# Altium footprint library Pcb-hionyPcbLib.PcbLib: 580 footprints (part 10 of 37)
Each footprint in its own frame and in the unit in brackets; x right, y up, seen from the top. Pads: shape width x height; smd on the part's side, far side on the other; paste and mask are expansions set on the pad; w line width, h text height; cw(c..) or ccw(c..) is an arc to the next point about the centre after c.
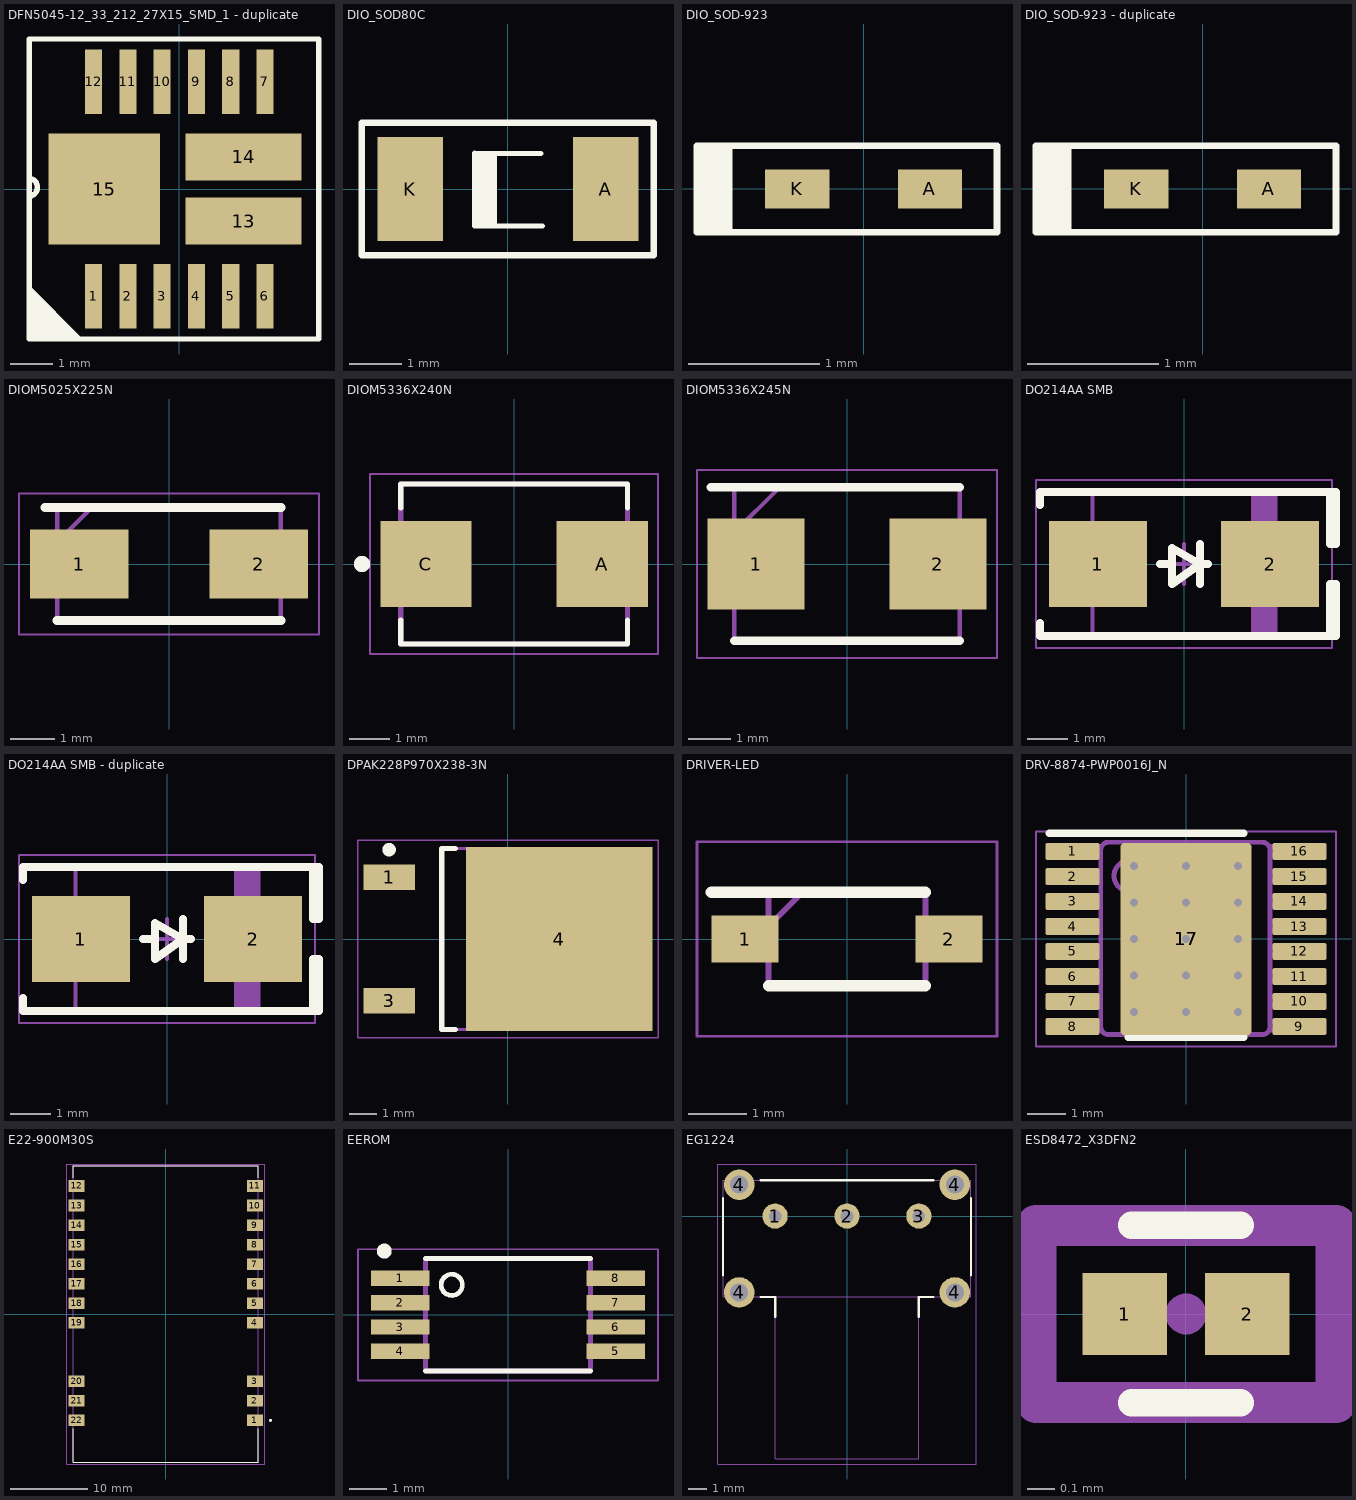
[diagram p9: the footprints below, top view; thin cyan lines are the x and y axes]

## DFN5045-12_33_212_27X15_SMD_1 - duplicate [mm]
pads (15):
  rect 0.4x1.5 smd: 1(-2,-2.5) 2(-1.2,-2.5) 3(-0.4,-2.5) 4(0.4,-2.5) 5(1.2,-2.5) 6(2,-2.5) 7(2,2.5) 8(1.2,2.5) 9(0.4,2.5) 10(-0.4,2.5) 11(-1.2,2.5) 12(-2,2.5)
  rect 2.7x1.1 smd: 13(1.5,-0.75) 14(1.5,0.75)
  rect 2.6x2.6 smd: 15(-1.75,0)
Top Overlay:
  region: -3.5,-2.25 -2.25,-3.5 -3.5,-3.5
  lines w0.127: -3.5,0.25 cw(c-3.519,0.041) -3.478,-0.164 ; -3.5,-3.5 -3.5,3.5 3.25,3.5 3.25,-3.5 -3.5,-3.5
3D body "DMHT6016LFJ-13.stp": height 0.9, standoff 0, extent -2.5,-2.36 2.5,2.36

## DIO_SOD80C [mm] "Voltage regulator diodes"
height 1.6
pads (2):
  rect 1.25x2 smd: A(1.875,0) K(-1.875,0)
Top Overlay:
  rectangle: -0.69,-0.71 -0.208,0.687
  lines w0.1: -0.639,-0.71 0.656,-0.71 ; -0.639,0.687 0.631,0.679
  lines w0.127: -2.8,-1.27 2.794,-1.27 2.794,1.27 -2.8,1.27 -2.8,-1.27
3D body "User Library-SOD80-3.STEP": height 1.5, standoff 0, extent -1.825,-0.775 1.775,0.725

## DIO_SOD-923 [mm]
pads (2):
  rect 0.49x0.3 smd: A(0.505,0) K(-0.505,0)
Top Overlay:
  rectangle: -1.27,-0.33 -1,0.33
  lines w0.05: -1.27,-0.33 1.016,-0.33 1.016,0.33 -1.27,0.33 -1.27,-0.33
3D body "DIODE_SOD-923.step": height 0.44, standoff 0.01, extent -0.525,-0.325 0.525,0.325

## DIO_SOD-923 - duplicate [mm]
pads (2):
  rect 0.49x0.3 smd: A(0.505,0) K(-0.505,0)
Top Overlay:
  rectangle: -1.27,-0.33 -1,0.33
  lines w0.05: -1.27,-0.33 -1.27,0.33 1.016,0.33 1.016,-0.33 -1.27,-0.33
3D body "DIODE_SOD-923.step": height 0.44, standoff 0.01, extent -0.525,-0.325 0.525,0.325

## DIOM5025X225N [mm]
pads (2):
  rect 2.2x1.55 smd: 1(-2,0) 2(2,0)
Top Overlay:
  lines w0.2: -2.775,1.262 2.5,1.262 ; -2.5,-1.262 2.5,-1.262
Mechanical 13:
  lines w0.1: -2.5,0.488 -1.725,1.262 ; -2.5,-1.262 -2.5,1.262 2.5,1.262 2.5,-1.262 -2.5,-1.262
Mechanical 15:
  lines w0.05: -3.35,-1.575 -3.35,1.575 3.35,1.575 3.35,-1.575 -3.35,-1.575
3D body "1SMA4742A.stp": height 2.25, standoff 0, extent -2.5,-1.262 2.5,1.262

## DIOM5336X240N [mm]
pads (2):
  rect 2.25x2.13 smd: A(2.175,0) C(-2.175,0)
Top Overlay:
  circle w0.2: c-3.75,0 r0.1
  lines w0.127: -2.795,-1.385 -2.795,-1.97 2.795,-1.97 2.795,-1.385 ; -2.795,1.385 -2.795,1.97 2.795,1.97 2.795,1.385
Mechanical 13:
  circle w0.2: c-3.75,0 r0.1
  lines w0.127: -2.795,-1.97 2.795,-1.97 2.795,1.97 -2.795,1.97 -2.795,-1.97
Mechanical 15:
  lines w0.05: -3.55,-2.22 -3.55,2.22 3.55,2.22 3.55,-2.22 -3.55,-2.22
3D body "step_temp.STEP": height 2.5, standoff 0, extent -2.648,-1.81 2.648,1.81

## DIOM5336X245N [mm]
pads (2):
  rect 2.3x2.15 smd: 1(-2.15,0) 2(2.15,0)
Top Overlay:
  lines w0.2: -3.225,1.812 2.67,1.812 ; -2.67,-1.812 2.67,-1.812
Mechanical 13:
  lines w0.1: -2.67,0.738 -1.595,1.812 ; -2.67,-1.812 2.67,-1.812 2.67,1.812 -2.67,1.812 -2.67,-1.812
Mechanical 15:
  lines w0.05: -3.55,-2.225 3.55,-2.225 3.55,2.225 -3.55,2.225 -3.55,-2.225
3D body "SMBJ20CA.stp": height 2.45, standoff 0, extent -2.67,-1.813 2.67,1.813

## DO214AA SMB [mm]
pads (2):
  rect 2.45x2.15 smd: 1(-2.15,0) 2(2.15,0)
Top Overlay:
  lines w0.2: -3.6,-1.475 -3.6,-1.8 3.8,-1.8 3.8,-0.5 3.65,-0.5 3.65,-1.8 ; -3.6,1.475 -3.6,1.8 3.8,1.8 3.8,0.5 3.65,0.5 3.65,1.8 ; -0.6,0 -0.3,0 ; 0.4,-0.5 0.4,0.5 ; 0.6,0 0.4,0 ; 0.4,0 -0.3,0.4 -0.3,-0.5 0.4,0
Mechanical 13:
  rectangle: 1.67,-1.8 2.285,1.8
  lines w0.1: -2.285,-1.8 2.285,-1.8 2.285,1.8 -2.285,1.8 -2.285,-1.8
Mechanical 15:
  lines w0.05: -3.7,-2.1 3.7,-2.1 3.7,2.1 -3.7,2.1 -3.7,-2.1
  lines w0.1: -0.5,0 0.5,0 ; 0,-0.5 0,0.5
3D body "SMB.STEP": height 2.4, standoff 0, extent -2.6,-1.799 2.6,1.8

## DO214AA SMB - duplicate [mm]
pads (2):
  rect 2.45x2.15 smd: 1(-2.15,0) 2(2.15,0)
Top Overlay:
  lines w0.2: -3.6,-1.475 -3.6,-1.8 3.8,-1.8 3.8,-0.5 3.65,-0.5 3.65,-1.8 ; -3.6,1.475 -3.6,1.8 3.8,1.8 3.8,0.5 3.65,0.5 3.65,1.8 ; -0.6,0 -0.3,0 ; 0.4,-0.5 0.4,0.5 ; 0.6,0 0.4,0 ; 0.4,0 -0.3,0.4 -0.3,-0.5 0.4,0
Mechanical 13:
  rectangle: 1.67,-1.8 2.285,1.8
  lines w0.1: -2.285,-1.8 2.285,-1.8 2.285,1.8 -2.285,1.8 -2.285,-1.8
Mechanical 15:
  lines w0.05: -3.7,-2.1 3.7,-2.1 3.7,2.1 -3.7,2.1 -3.7,-2.1
  lines w0.1: -0.5,0 0.5,0 ; 0,-0.5 0,0.5
3D body "SMB.STEP": height 2.4, standoff 0, extent -2.6,-1.799 2.6,1.8

## DPAK228P970X238-3N [mm] "D-PAK, 3-Pads, Body 6.20x6.72mm (max), IPC Medium Density"
height 2.38
pads (3):
  rect 1.9x0.95 smd: 1(-4.4,2.28) 3(-4.4,-2.28)
  rect 6.9x6.8 smd: 4(1.9,0)
Top Overlay:
  circle w0.25: c-4.4,3.305 r0.125
  lines w0.2: -1.95,-3.35 -2.45,-3.35 -2.45,3.35 -1.95,3.35
Top Courtyard:
  lines w0.05: -5.55,-3.65 5.55,-3.65 5.55,3.65 -5.55,3.65 -5.55,-3.65
  lines w0.1: -0.5,0 0.5,0 ; 0,-0.5 0,0.5
Top Assembly:
  lines w0.1: -2.45,-3.35 3.75,-3.35 3.75,3.35 -2.45,3.35 -2.45,-3.35
3D body "DPAK228P970X238-3N.step": height 2.38, standoff 0, extent -4.415,-3.35 5.285,3.35

## DRIVER-LED [mm]
pads (2):
  rect 1.15x0.8 smd: 1(-1.75,0) 2(1.75,0)
Top Overlay:
  lines w0.2: -2.325,0.8 1.345,0.8 ; -1.345,-0.8 1.345,-0.8
Mechanical 15:
  lines w0.1: -1.345,0.225 -0.77,0.8 ; -1.345,-0.8 -1.345,0.8 1.345,0.8 1.345,-0.8 -1.345,-0.8
Mechanical 20:
  lines w0.05: -2.575,-1.67 -2.575,1.67 2.575,1.67 2.575,-1.67 -2.575,-1.67
3D body "NSI50010YT1G.stp": height 1.35, standoff 0, extent -1.855,-0.8 1.855,0.8

## DRV-8874-PWP0016J_N [mm]
pads (19):
  rrect22% 1.4x0.45 smd: 1(-2.95,2.275) 2(-2.95,1.625) 3(-2.95,0.975) 4(-2.95,0.325) 5(-2.95,-0.325) 6(-2.95,-0.975) 7(-2.95,-1.625) 8(-2.95,-2.275) 9(2.95,-2.275) 10(2.95,-1.625) 11(2.95,-0.975) 12(2.95,-0.325) 13(2.95,0.325) 14(2.95,0.975) 15(2.95,1.625) 16(2.95,2.275)
  rrect6% 3.4x5 smd paste-1.7 mask-1.7: 17(0,0)
  rrect50% 2.46x3.55 on Top Paste: 17(0,0)
  rrect50% 2.46x3.55 on Top Solder: 17(0,0)
via -1.35,0.95 diameter 0.5 hole 0.2
via -1.35,0 diameter 0.5 hole 0.2
via -1.35,-1.9 diameter 0.5 hole 0.2
via -1.35,1.9 diameter 0.5 hole 0.2
via -1.35,-0.95 diameter 0.5 hole 0.2
via 1.35,0 diameter 0.5 hole 0.2
via 1.35,-0.95 diameter 0.5 hole 0.2
via 1.35,0.95 diameter 0.5 hole 0.2
via 1.35,1.9 diameter 0.5 hole 0.2
via 1.35,-1.9 diameter 0.5 hole 0.2
via 0,-1.9 diameter 0.5 hole 0.2
via 0,1.9 diameter 0.5 hole 0.2
via 0,0.95 diameter 0.5 hole 0.2
via 0,-0.95 diameter 0.5 hole 0.2
via 0,0 diameter 0.5 hole 0.2
Top Overlay:
  lines w0.2: -3.55,2.75 1.5,2.75 ; -1.5,-2.55 1.5,-2.55
Top 3D Body:
  drawing of 202 lines, arcs and shapes, not listed
  text ".Designator" at -0.5,1.85 h1.02
Mechanical 15:
  lines w0.05: -3.9,-2.8 -3.9,2.8 3.9,2.8 3.9,-2.8 -3.9,-2.8
  lines w0.1: -0.5,0 0.5,0 ; 0,-0.5 0,0.5
3D body "PWP0016J.stp": height 1.13, standoff 0, extent -3.2,-2.5 3.2,2.5

## E22-900M30S [mm]
height 3.97
pads (22):
  rect 2.08x1.51 smd: 1(11.575,-13.82) 2(11.575,-11.28) 3(11.575,-8.74) 4(11.575,-1.14) 5(11.575,1.4) 6(11.575,3.94) 7(11.575,6.48) 8(11.575,9.02) 9(11.575,11.56) 10(11.575,14.1) 11(11.575,16.64) 12(-11.575,16.64) 13(-11.575,14.1) 14(-11.575,11.56) 15(-11.575,9.02) 16(-11.575,6.48) 17(-11.575,3.94) 18(-11.575,1.4) 19(-11.575,-1.14) 20(-11.575,-8.74) 21(-11.575,-11.28) 22(-11.575,-13.82)
Top Overlay:
  circle w0.2: c13.615,-13.82 r0.1
  lines w0.127: -12,-14.895 -12,-19.25 12,-19.25 12,-14.895 ; -12,17.715 -12,19.25 12,19.25 12,17.715
Mechanical 13:
  circle w0.2: c13.615,-13.82 r0.1
  lines w0.127: -12,-19.25 -12,19.25 12,19.25 12,-19.25 -12,-19.25
Mechanical 15:
  lines w0.05: -12.865,-19.5 12.865,-19.5 12.865,19.5 -12.865,19.5 -12.865,-19.5
3D body "step_temp.STEP": height 3.87, standoff -0.01, extent -12.137,-19.293 11.883,19.207

## EEROM [mm]
pads (8):
  rect 1.56x0.41 smd: 1(-2.88,0.975) 2(-2.88,0.325) 3(-2.88,-0.325) 4(-2.88,-0.975) 5(2.88,-0.975) 6(2.88,-0.325) 7(2.88,0.325) 8(2.88,0.975)
Top Overlay:
  circle w0.127: c-1.5,0.8 r0.283
  circle w0.2: c-3.3,1.7 r0.1
  lines w0.127: -2.2,-1.5 2.2,-1.5 ; -2.2,1.5 2.2,1.5
Mechanical 13:
  lines w0.127: -2.2,-1.5 -2.2,1.5 2.2,1.5 2.2,-1.5 -2.2,-1.5
Mechanical 15:
  lines w0.05: -4,-1.75 -4,1.75 4,1.75 4,-1.75 -4,-1.75
3D body "M24C16-RDW6TP.STEP": height 1.11, standoff -0.09, extent -3.2,-1.5 3.2,1.5

## EG1224 [mm]
pads (7):
  round 1.4 hole 0.7: 1(-4,0) 2(0,0) 3(4,0)
  round 1.7 hole 1: 4(-6,-4.25) 4(-6,1.75) 4(6,-4.25) 4(6,1.75)
Top Overlay:
  lines w0.127: -6.9,-3.3 -6.9,1 ; -4.8,-4.5 -4,-4.5 -4,-5.6 ; -4.8,2 4.8,2 ; 4,-5.6 4,-4.5 4.8,-4.5 ; 6.9,-3.3 6.9,1
Mechanical 11:
  text ".Designator" at -0.55,-1.625 h0.5
Mechanical 13:
  lines w0.05: -4,-4.5 -4,-13.5 4,-13.5 4,-4.5 ; -6.9,-4.5 6.9,-4.5 6.9,2 -6.9,2 -6.9,-4.5
Mechanical 15:
  lines w0.05: -7.2,2.9 -7.2,-5.4 -7.2,-13.8 7.2,-13.8 7.2,2.901 -7.199,2.901
3D body: height 0, standoff -3.5, extent 3.75,-0.2 4.25,0.2
3D body: height 0, standoff -3.5, extent -0.25,-0.2 0.25,0.2
3D body: height 0, standoff -3.5, extent -4.25,-0.2 -3.75,0.2
3D body: height 0, standoff -3.5, extent 5.6,-4.5 6.4,-4
3D body: height 0, standoff -3.5, extent 5.6,1.5 6.4,2
3D body: height 0, standoff -3.5, extent -6.4,1.5 -5.6,2
3D body: height 0, standoff -3.5, extent -6.4,-4.5 -5.6,-4
3D body: height 7.5, standoff 3.5, extent -4,-13.5 1,-4.5
3D body: height 8.5, standoff 0, extent -6.9,-4.5 6.9,2

## ESD8472_X3DFN2 [mm]
pads (2):
  rect 0.31x0.3 smd mask+0.05: 1(-0.225,0) 2(0.225,0)
Top Overlay:
  lines w0.1: -0.2,-0.325 0.2,-0.325 ; -0.2,0.325 0.2,0.325
Top Solder:
  region: -0.4,0.2 -0.4,-0.2 0.4,-0.2 0.4,0.2
Mechanical 15:
  circle w0.1: c0,0 r0.025
  lines w0.15: -0.55,-0.325 0.55,-0.325 0.55,0.325 -0.55,0.325 -0.55,-0.325
  text ".Designator" at -0.9,0.225 h0.55